# Altium footprint library Generic Footprint.PcbLib: 160 footprints (part 18 of 20) (continued)
## Symbol_FCC-Logo-15x10_Silkscreen [mil] (continued)
1(71.59,161.59) 1(71.59,162.26) 1(71.59,162.93) 1(71.59,163.6) 1(71.59,164.27) 1(71.59,164.94) 1(71.59,165.61) 1(71.59,166.28) 1(71.59,166.94) 1(71.59,167.61) 1(71.59,168.28) 1(71.59,168.95) 1(71.59,169.62) 1(71.59,170.29) 1(71.59,170.96) 1(71.59,171.63) 1(71.59,172.3) 1(71.59,172.97) 1(71.59,173.64) 1(71.59,174.31) 1(71.59,174.98) 1(71.59,175.65) 1(71.59,176.98) 1(71.59,229.86) 1(71.59,336.28) 1(71.59,336.94) 1(71.59,337.61) 1(71.59,338.28) 1(71.59,338.95) 1(71.59,339.62) 1(72.26,176.98) 1(72.26,177.65) 1(72.26,178.32) 1(72.26,229.86) 1(72.26,336.94) 1(72.26,337.61) 1(72.26,338.28) 1(72.26,340.29) 1(72.93,179.66) 1(72.93,229.19) 1(72.93,230.53) 1(72.93,339.62) 1(72.93,340.29) 1(72.93,341.63) 1(73.6,339.62) 1(73.6,340.29) 1(73.6,340.96) 1(73.6,341.63) 1(74.27,342.97) 1(74.94,341.63) 1(74.94,342.97) 1(74.94,343.64) 1(75.6,178.32) 1(75.6,178.99) 1(75.6,179.66) 1(75.6,342.3) 1(75.6,343.64) 1(76.27,344.31) 1(76.94,342.97) 1(76.94,344.31) 1(77.61,343.64) 1(78.28,344.31) 1(78.95,344.98) 1(78.95,346.31) 1(80.29,345.65) 1(80.29,346.31) 1(80.29,346.98) 1(81.63,346.31) 1(81.63,346.98) 1(81.63,347.65) 1(201.43,229.19) 1(201.43,230.53) 1(202.1,178.99) 1(202.77,172.97) 1(202.77,173.64) 1(202.77,174.31) 1(202.77,174.98) 1(202.77,175.65) 1(202.77,176.31) 1(202.77,176.98) 1(202.77,177.65) 1(202.77,230.53) 1(202.77,232.54) 1(202.77,233.2) 1(202.77,233.87) 1(202.77,234.54) 1(202.77,235.21) 1(202.77,235.88) 1(203.44,168.28) 1(203.44,168.95) 1(203.44,169.62) 1(203.44,170.29) 1(203.44,170.96) 1(203.44,171.63) 1(203.44,172.97) 1(203.44,173.64) 1(203.44,174.31) 1(203.44,174.98) 1(203.44,175.65) 1(203.44,176.31) 1(203.44,176.98) 1(203.44,230.53) 1(203.44,231.2) 1(203.44,232.54) 1(203.44,233.2) 1(203.44,233.87) 1(203.44,234.54) 1(203.44,235.21) 1(203.44,235.88) 1(203.44,237.22) 1(203.44,237.89) 1(203.44,238.56) 1(203.44,239.23) 1(203.44,239.9) 1(204.11,164.94) 1(204.11,165.61) 1(204.11,166.28) 1(204.11,166.94) 1(204.11,168.28) 1(204.11,168.95) 1(204.11,169.62) 1(204.11,170.29) 1(204.11,170.96) 1(204.11,171.63) 1(204.11,172.3) 1(204.11,172.97) 1(204.11,173.64) 1(204.11,174.31) 1(204.11,174.98) 1(204.11,175.65) 1(204.11,176.31) 1(204.11,176.98) 1(204.11,231.87) 1(204.11,232.54) 1(204.11,233.2) 1(204.11,233.87) 1(204.11,234.54) 1(204.11,235.21) 1(204.11,235.88) 1(204.11,236.55) 1(204.11,237.22) 1(204.11,237.89) 1(204.11,238.56) 1(204.11,239.23) 1(204.11,239.9) 1(204.11,241.24) 1(204.11,241.91) 1(204.11,242.57) 1(204.11,243.24) 1(204.11,243.91) 1(204.78,162.26) 1(204.78,163.6) 1(204.78,171.63) 1(204.78,237.22) 1(204.78,243.91) 1(204.78,244.58) 1(204.78,247.26) 1(205.45,158.24) 1(205.45,158.91) 1(205.45,159.58) 1(205.45,160.25) 1(205.45,160.92) 1(205.45,161.59) 1(205.45,162.93) 1(205.45,164.94) 1(205.45,165.61) 1(205.45,166.28) 1(205.45,166.94) 1(205.45,167.61) 1(205.45,168.28) 1(205.45,168.95) 1(205.45,169.62) 1(205.45,170.29) 1(205.45,170.96) 1(205.45,237.89) 1(205.45,238.56) 1(205.45,239.23) 1(205.45,239.9) 1(205.45,240.57) 1(205.45,241.24) 1(205.45,241.91) 1(205.45,242.57) 1(205.45,243.24) 1(205.45,244.58) 1(205.45,245.25) 1(205.45,245.92) 1(205.45,246.59) 1(205.45,247.93) 1(205.45,248.6) 1(205.45,249.27) 1(205.45,249.94) 1(205.45,250.61) 1(206.12,155.57) 1(206.12,156.24) 1(206.12,156.91) 1(206.12,157.57) 1(206.12,161.59) 1(206.12,162.26) 1(206.12,162.93) 1(206.12,163.6) 1(206.12,164.27) 1(206.12,164.94) 1(206.12,165.61) 1(206.12,166.28) 1(206.12,166.94) 1(206.12,241.24) 1(206.12,241.91) 1(206.12,242.57) 1(206.12,243.24) 1(206.12,243.91) 1(206.12,244.58) 1(206.12,245.25) 1(206.12,245.92) 1(206.12,246.59) 1(206.12,247.26) 1(206.12,247.93) 1(206.12,251.28) 1(206.12,251.94) 1(206.12,252.61) 1(206.12,253.28) 1(206.79,152.22) 1(206.79,152.89) 1(206.79,153.56) 1(206.79,154.23) 1(206.79,154.9) 1(206.79,158.24) 1(206.79,160.25) 1(206.79,161.59) 1(206.79,162.26) 1(206.79,162.93) 1(206.79,163.6) 1(206.79,245.25) 1(206.79,245.92) 1(206.79,246.59) 1(206.79,247.26) 1(206.79,247.93) 1(206.79,249.27) 1(206.79,249.94) 1(206.79,250.61) 1(206.79,253.95) 1(206.79,254.62) 1(206.79,255.29) 1(206.79,255.96) 1(206.79,256.63) 1(207.46,158.24) 1(207.46,160.25) 1(207.46,249.27) 1(207.46,249.94) 1(207.46,250.61) 1(208.12,150.21) 1(208.12,150.88) 1(208.12,151.55) 1(208.12,257.3) 1(208.12,257.97) 1(208.12,258.64) 1(208.79,146.87) 1(208.79,147.54) 1(208.79,148.2) 1(208.79,148.87) 1(208.79,150.21) 1(208.79,150.88) 1(208.79,257.97) 1(208.79,258.64) 1(208.79,259.98) 1(208.79,260.65) 1(208.79,261.31) 1(208.79,261.98) 1(209.46,144.86) 1(209.46,145.53) 1(209.46,146.87) 1(209.46,147.54) 1(209.46,148.2) 1(209.46,148.87) 1(209.46,149.54) 1(209.46,150.21) 1(209.46,150.88) 1(209.46,257.97) 1(209.46,258.64) 1(209.46,259.98) 1(209.46,260.65) 1(209.46,261.31) 1(209.46,261.98) 1(209.46,263.32) 1(210.13,142.85) 1(210.13,143.52) 1(210.13,144.86) 1(210.13,145.53) 1(210.13,146.87) 1(210.13,147.54) 1(210.13,148.2) 1(210.13,148.87) 1(210.13,259.31) 1(210.13,259.98) 1(210.13,260.65) 1(210.13,261.31) 1(210.13,261.98) 1(210.13,263.32) 1(210.13,264.66) 1(210.13,265.33) 1(210.13,266) 1(210.8,140.17) 1(210.8,140.84) 1(210.8,141.51) 1(210.8,142.85) 1(210.8,143.52) 1(210.8,144.86) 1(210.8,145.53) 1(210.8,146.2) 1(210.8,262.65) 1(210.8,263.32) 1(210.8,263.99) 1(210.8,264.66) 1(210.8,265.33) 1(210.8,266) 1(210.8,267.34) 1(210.8,268.01) 1(211.47,138.83) 1(211.47,139.5) 1(211.47,144.19) 1(211.47,264.66) 1(211.47,266.67) 1(211.47,268.01) 1(211.47,268.68) 1(211.47,269.35) 1(211.47,270.02) 1(212.14,136.16) 1(212.14,136.83) 1(212.14,137.5) 1(212.14,138.17) 1(212.14,140.17) 1(212.14,140.84) 1(212.14,142.18) 1(212.14,142.85) 1(212.14,143.52) 1(212.14,265.33) 1(212.14,266) 1(212.14,267.34) 1(212.14,270.68) 1(212.14,271.35) 1(212.14,272.02) 1(212.14,272.69) 1(212.14,416.59) 1(212.81,133.48) 1(212.81,134.15) 1(212.81,134.82) 1(212.81,135.49) 1(212.81,138.17) 1(212.81,138.83) 1(212.81,140.17) 1(212.81,140.84) 1(212.81,267.34) 1(212.81,268.01) 1(212.81,269.35) 1(212.81,270.02) 1(212.81,270.68) 1(212.81,273.36) 1(212.81,274.03) 1(212.81,274.7) 1(212.81,415.25) 1(212.81,415.92) 1(212.81,416.59) 1(213.48,132.81) 1(213.48,133.48) 1(213.48,134.15) 1(213.48,138.17) 1(213.48,138.83) 1(213.48,269.35) 1(213.48,270.02) 1(213.48,270.68) 1(213.48,274.7) 1(213.48,275.37) 1(213.48,276.04) 1(213.48,348.99) 1(213.48,349.66) 1(213.48,350.33) 1(213.48,351) 1(213.48,351.67) 1(213.48,352.34) 1(213.48,353.01) 1(213.48,353.68) 1(213.48,354.35) 1(213.48,355.02) 1(213.48,355.68) 1(213.48,356.35) 1(213.48,357.02) 1(213.48,357.69) 1(213.48,358.36) 1(213.48,359.03) 1(213.48,359.7) 1(213.48,360.37) 1(213.48,361.04) 1(213.48,361.71) 1(213.48,362.38) 1(213.48,363.05) 1(213.48,363.72) 1(213.48,364.39) 1(213.48,365.05) 1(213.48,365.72) 1(213.48,366.39) 1(213.48,367.06) 1(213.48,367.73) 1(213.48,368.4) 1(213.48,369.07) 1(213.48,369.74) 1(213.48,370.41) 1(213.48,371.08) 1(213.48,371.75) 1(213.48,372.42) 1(213.48,373.09) 1(213.48,373.76) 1(213.48,374.42) 1(213.48,375.09) 1(213.48,375.76) 1(213.48,376.43) 1(213.48,377.1) 1(213.48,377.77) 1(213.48,378.44) 1(213.48,379.11) 1(213.48,379.78) 1(213.48,380.45) 1(213.48,381.12) 1(213.48,381.79) 1(213.48,382.46) 1(213.48,383.13) 1(213.48,383.8) 1(213.48,384.46) 1(213.48,385.13) 1(213.48,385.8) 1(213.48,386.47) 1(213.48,387.14) 1(213.48,387.81) 1(213.48,388.48) 1(213.48,389.15) 1(213.48,389.82) 1(213.48,390.49) 1(213.48,391.16) 1(213.48,391.83) 1(213.48,392.5) 1(213.48,393.17) 1(213.48,393.83) 1(213.48,394.5) 1(213.48,395.17) 1(213.48,395.84) 1(213.48,396.51) 1(213.48,397.18) 1(213.48,397.85) 1(213.48,398.52) 1(213.48,399.19) 1(213.48,399.86) 1(213.48,400.53) 1(213.48,401.2) 1(213.48,401.87) 1(213.48,402.54) 1(213.48,403.2) 1(213.48,403.87) 1(213.48,404.54) 1(213.48,405.21) 1(213.48,405.88) 1(213.48,406.55) 1(213.48,407.22) 1(213.48,407.89) 1(213.48,408.56) 1(213.48,409.23) 1(213.48,409.9) 1(213.48,410.57) 1(213.48,411.24) 1(213.48,411.91) 1(213.48,412.57) 1(213.48,413.24) 1(213.48,413.91) 1(213.48,414.58) 1(213.48,415.25) 1(213.48,415.92) 1(213.48,416.59) 1(213.48,417.26) 1(214.15,132.81) 1(214.15,133.48) 1(214.15,134.15) 1(214.15,274.7) 1(214.15,276.04) 1(214.15,278.05) 1(214.15,348.99) 1(214.15,349.66) 1(214.15,350.33) 1(214.15,351) 1(214.15,351.67) 1(214.15,352.34) 1(214.15,353.01) 1(214.15,353.68) 1(214.15,354.35) 1(214.15,355.02) 1(214.15,355.68) 1(214.15,356.35) 1(214.15,357.02) 1(214.15,357.69) 1(214.15,358.36) 1(214.15,359.03) 1(214.15,359.7) 1(214.15,360.37) 1(214.15,361.04) 1(214.15,361.71) 1(214.15,362.38) 1(214.15,363.05) 1(214.15,363.72) 1(214.15,364.39) 1(214.15,365.05) 1(214.15,365.72) 1(214.15,366.39) 1(214.15,367.06) 1(214.15,367.73) 1(214.15,368.4) 1(214.15,369.07) 1(214.15,369.74) 1(214.15,370.41) 1(214.15,371.08) 1(214.15,371.75) 1(214.15,372.42) 1(214.15,373.09) 1(214.15,373.76) 1(214.15,374.42) 1(214.15,375.09) 1(214.15,375.76) 1(214.15,376.43) 1(214.15,377.1) 1(214.15,377.77) 1(214.15,378.44) 1(214.15,379.11) 1(214.15,379.78) 1(214.15,380.45) 1(214.15,381.12) 1(214.15,381.79) 1(214.15,382.46) 1(214.15,383.13) 1(214.15,383.8) 1(214.15,384.46) 1(214.15,385.13) 1(214.15,385.8) 1(214.15,386.47) 1(214.15,387.14) 1(214.15,387.81) 1(214.15,388.48) 1(214.15,389.15) 1(214.15,389.82) 1(214.15,390.49) 1(214.15,391.16) 1(214.15,391.83) 1(214.15,392.5) 1(214.15,393.17) 1(214.15,393.83) 1(214.15,394.5) 1(214.15,395.17) 1(214.15,395.84) 1(214.15,396.51) 1(214.15,397.18) 1(214.15,397.85) 1(214.15,398.52) 1(214.15,399.19) 1(214.15,399.86) 1(214.15,400.53) 1(214.15,401.2) 1(214.15,401.87) 1(214.15,402.54) 1(214.15,403.2) 1(214.15,403.87) 1(214.15,404.54) 1(214.15,405.21) 1(214.15,405.88) 1(214.15,406.55) 1(214.15,407.22) 1(214.15,407.89) 1(214.15,408.56) 1(214.15,409.23) 1(214.15,409.9) 1(214.15,410.57) 1(214.15,411.24) 1(214.15,411.91) 1(214.15,412.57) 1(214.15,413.24) 1(214.15,413.91) 1(214.15,415.25) 1(214.15,415.92) 1(214.82,130.13) 1(214.82,130.8) 1(214.82,131.47) 1(214.82,277.38) 1(214.82,278.72) 1(214.82,348.99) 1(214.82,349.66) 1(214.82,350.33) 1(214.82,351) 1(214.82,351.67) 1(214.82,352.34) 1(214.82,353.01) 1(214.82,353.68) 1(214.82,354.35) 1(214.82,355.02) 1(214.82,355.68) 1(214.82,356.35) 1(214.82,357.02) 1(214.82,357.69) 1(214.82,358.36) 1(214.82,359.03) 1(214.82,359.7) 1(214.82,360.37) 1(214.82,361.04) 1(214.82,361.71) 1(214.82,362.38) 1(214.82,363.05) 1(214.82,363.72) 1(214.82,364.39) 1(214.82,365.05) 1(214.82,365.72) 1(214.82,366.39) 1(214.82,367.06) 1(214.82,367.73) 1(214.82,368.4) 1(214.82,369.07) 1(214.82,369.74) 1(214.82,370.41) 1(214.82,371.08) 1(214.82,371.75) 1(214.82,372.42) 1(214.82,373.09) 1(214.82,373.76) 1(214.82,374.42) 1(214.82,375.09) 1(214.82,375.76) 1(214.82,376.43) 1(214.82,377.1) 1(214.82,377.77) 1(214.82,378.44) 1(214.82,379.11) 1(214.82,379.78) 1(214.82,380.45) 1(214.82,381.12) 1(214.82,381.79) 1(214.82,382.46) 1(214.82,383.13) 1(214.82,383.8) 1(214.82,384.46) 1(214.82,385.13) 1(214.82,385.8) 1(214.82,386.47) 1(214.82,387.14) 1(214.82,387.81) 1(214.82,388.48) 1(214.82,389.15) 1(214.82,389.82) 1(214.82,390.49) 1(214.82,391.16) 1(214.82,391.83) 1(214.82,392.5) 1(214.82,393.17) 1(214.82,393.83) 1(214.82,394.5) 1(214.82,395.17) 1(214.82,395.84) 1(214.82,396.51) 1(214.82,397.18) 1(214.82,397.85) 1(214.82,398.52) 1(214.82,399.19) 1(214.82,399.86) 1(214.82,400.53) 1(214.82,401.2) 1(214.82,401.87) 1(214.82,402.54) 1(214.82,403.2) 1(214.82,403.87) 1(214.82,404.54) 1(214.82,405.21) 1(214.82,405.88) 1(214.82,406.55) 1(214.82,407.22) 1(214.82,407.89) 1(214.82,408.56) 1(214.82,409.23) 1(214.82,409.9) 1(214.82,410.57) 1(214.82,411.24) 1(214.82,411.91) 1(214.82,412.57) 1(214.82,413.24) 1(215.49,128.79) 1(215.49,130.13) 1(215.49,130.8) 1(215.49,131.47) 1(215.49,132.14) 1(215.49,132.81) 1(215.49,276.04) 1(215.49,276.71) 1(215.49,277.38) 1(215.49,278.05) 1(215.49,278.72) 1(215.49,280.05) 1(215.49,347.65) 1(215.49,348.32) 1(215.49,413.91) 1(216.16,125.45) 1(216.16,126.79) 1(216.16,127.46) 1(216.16,128.79) 1(216.16,130.13) 1(216.16,130.8) 1(216.16,131.47) 1(216.16,277.38) 1(216.16,278.05) 1(216.16,278.72) 1(216.16,280.05) 1(216.16,281.39) 1(216.16,282.06) 1(216.16,347.65) 1(216.83,124.11) 1(216.83,126.79) 1(216.83,127.46) 1(216.83,128.79) 1(216.83,129.46) 1(216.83,279.39) 1(216.83,280.05) 1(216.83,281.39) 1(216.83,282.06) 1(216.83,283.4) 1(216.83,285.41) 1(216.83,346.98) 1(217.49,123.44) 1(217.49,125.45) 1(217.49,126.12) 1(217.49,126.79) 1(217.49,127.46) 1(217.49,128.13) 1(217.49,280.72) 1(217.49,281.39) 1(217.49,282.06) 1(217.49,282.73) 1(217.49,283.4) 1(217.49,284.74) 1(217.49,286.75) 1(218.16,121.43) 1(218.16,122.1) 1(218.16,122.77) 1(218.16,286.08) 1(218.83,120.09) 1(218.83,120.76) 1(218.83,124.78) 1(218.83,125.45) 1(218.83,283.4) 1(218.83,284.07) 1(218.83,287.42) 1(218.83,288.09) 1(218.83,288.76) 1(219.5,118.76) 1(219.5,119.42) 1(219.5,120.09) 1(219.5,288.76) 1(219.5,289.42) 1(219.5,290.09) 1(220.17,116.75) 1(220.17,117.42) 1(220.17,118.76) 1(220.17,119.42) 1(220.17,120.09) 1(220.17,288.76) 1(220.17,289.42) 1(220.17,290.09) 1(220.17,291.43) 1(220.84,116.08) 1(220.84,116.75) 1(220.84,117.42) 1(220.84,118.09) 1(220.84,118.76) 1(220.84,119.42) 1(220.84,289.42) 1(220.84,290.09) 1(220.84,291.43) 1(220.84,292.77) 1(221.51,290.76) 1(222.18,112.73) 1(222.18,114.07) 1(222.18,116.08) 1(222.18,116.75) 1(222.18,117.42) 1(222.18,291.43) 1(222.18,292.1) 1(222.18,292.77) 1(222.18,294.11) 1(222.18,294.78) 1(222.85,111.39) 1(222.85,112.06) 1(222.85,114.07) 1(222.85,115.41) 1(222.85,116.08) 1(222.85,292.77) 1(222.85,293.44) 1(222.85,294.11) 1(222.85,294.78) 1(222.85,296.12) 1(222.85,296.79) 1(223.52,110.05) 1(223.52,110.72) 1(223.52,112.06) 1(223.52,112.73) 1(223.52,114.07) 1(223.52,114.74) 1(223.52,294.11) 1(223.52,294.78) 1(223.52,296.12) 1(223.52,296.79) 1(223.52,297.46) 1(223.52,298.13) 1(223.52,298.8) 1(224.19,108.72) 1(224.19,112.06) 1(224.19,112.73) 1(224.19,113.4) 1(224.19,295.45) 1(224.19,296.12) 1(224.19,296.79) 1(224.19,300.13) 1(224.86,109.39) 1(224.86,299.46) 1(225.53,106.71) 1(225.53,107.38) 1(225.53,108.05) 1(225.53,300.8) 1(225.53,301.47) 1(225.53,302.14) 1(226.2,106.04) 1(226.2,106.71) 1(226.2,107.38) 1(226.2,300.8) 1(226.2,301.47) 1(226.2,302.81) 1(226.86,104.7) 1(226.86,106.04) 1(226.86,106.71) 1(226.86,107.38) 1(226.86,300.8) 1(226.86,301.47) 1(226.86,302.81) 1(227.53,103.36) 1(227.53,104.7) 1(227.53,106.04) 1(227.53,302.81) 1(227.53,305.49) 1(228.2,101.35) 1(228.2,102.02) 1(228.2,104.03) 1(228.2,304.82) 1(228.2,306.16) 1(228.2,306.83) 1(228.87,102.69) 1(228.87,103.36) 1(228.87,104.7) 1(228.87,105.37) 1(228.87,303.48) 1(228.87,304.15) 1(228.87,305.49) 1(228.87,307.5) 1(229.54,99.35) 1(229.54,100.02) 1(229.54,100.68) 1(229.54,101.35) 1(229.54,102.02) 1(229.54,103.36) 1(229.54,305.49) 1(229.54,306.16) 1(229.54,306.83) 1(229.54,307.5) 1(229.54,308.17) 1(229.54,308.83) 1(230.21,98.68) 1(230.21,101.35) 1(230.21,102.02) 1(230.21,306.16) 1(230.21,306.83) 1(230.21,307.5) 1(230.21,309.5) 1(230.21,310.17) 1(230.88,98.01) 1(230.88,98.68) 1(230.88,310.17) 1(230.88,310.84) 1(231.55,98.68) 1(232.22,95.33) 1(232.22,96) 1(232.22,96.67) 1(232.22,98.01) 1(232.22,310.17) 1(232.22,312.18) 1(232.22,312.85) 1(232.89,95.33) 1(232.89,96) 1(232.89,96.67) 1(232.89,97.34) 1(232.89,98.01) 1(232.89,311.51) 1(232.89,312.18) 1(232.89,312.85) 1(232.89,313.52) 1(233.56,93.32) 1(233.56,93.99) 1(233.56,96) 1(233.56,96.67) 1(233.56,312.18) 1(233.56,312.85) 1(233.56,313.52) 1(233.56,314.86) 1(233.56,315.53) 1(234.23,93.99) 1(234.23,94.66) 1(234.23,95.33) 1(234.23,313.52) 1(234.23,314.86) 1(234.9,91.31) 1(234.9,91.98) 1(234.9,92.65) 1(234.9,93.99) 1(234.9,314.19) 1(234.9,315.53) 1(234.9,316.2) 1(234.9,316.87) 1(234.9,317.54) 1(235.57,91.98) 1(235.57,314.86) 1(235.57,315.53) 1(235.57,316.87) 1(236.23,89.31) 1(236.23,89.98) 1(236.23,90.65) 1(236.23,91.98) 1(236.23,316.87) 1(236.23,318.2) 1(236.23,318.87) 1(236.23,319.54) 1(236.9,88.64) 1(236.9,318.87) 1(236.9,320.21) 1(237.57,87.97) 1(237.57,318.87) 1(237.57,320.21) 1(238.24,320.21) 1(238.24,320.88) 1(238.24,321.55) 1(238.24,322.22) 1(238.91,85.96) 1(238.91,86.63) 1(238.91,320.88) 1(238.91,321.55) 1(238.91,322.89) 1(239.58,84.62) 1(239.58,85.96) 1(239.58,86.63) 1(239.58,320.88) 1(239.58,321.55) 1(239.58,322.22) 1(240.25,83.28) 1(240.25,83.95) 1(240.25,86.63) 1(240.25,87.3) 1(240.25,322.22) 1(240.25,322.89) 1(240.25,324.23) 1(240.25,324.9) 1(240.92,82.61) 1(240.92,83.95) 1(240.92,84.62) 1(240.92,85.29) 1(240.92,85.96) 1(240.92,322.89) 1(240.92,323.56) 1(240.92,324.23) 1(240.92,325.57) 1(241.59,84.62) 1(241.59,324.23) 1(241.59,324.9) 1(241.59,326.24) 1(242.26,81.28) 1(242.26,81.94) 1(242.26,83.95) 1(242.26,324.9) 1(242.26,326.91) 1(242.26,327.57) 1(242.93,80.61) 1(242.93,81.28) 1(242.93,81.94) 1(242.93,326.91) 1(242.93,328.24) 1(243.6,79.94) 1(243.6,80.61) 1(243.6,81.94) 1(243.6,326.91) 1(243.6,327.57) 1(243.6,328.24) 1(243.6,328.91) 1(244.27,79.27) 1(244.27,79.94) 1(244.27,81.28) 1(244.27,327.57) 1(244.27,328.24) 1(244.27,328.91) 1(244.27,329.58) 1(244.94,77.93) 1(244.94,79.27) 1(244.94,80.61) 1(244.94,330.92) 1(245.6,76.59) 1(245.6,77.26) 1(245.6,79.94) 1(245.6,328.91) 1(245.6,329.58) 1(245.6,331.59) 1(246.27,75.92) 1(246.27,77.26) 1(246.27,77.93) 1(246.27,78.6) 1(246.27,79.27) 1(246.27,329.58) 1(246.27,330.92) 1(246.27,331.59) 1(246.27,332.26) 1(246.94,75.25) 1(246.94,76.59) 1(246.94,77.26) 1(246.94,77.93) 1(246.94,330.25) 1(246.94,330.92) 1(246.94,332.26) 1(246.94,332.93) 1(247.61,75.92) 1(247.61,76.59) 1(247.61,331.59) 1(247.61,332.26) 1(247.61,334.27) 1(248.28,333.6) 1(248.28,334.94) 1(248.95,73.24) 1(248.95,73.91) 1(248.95,74.58) 1(248.95,75.92) 1(248.95,335.61) 1(249.62,72.57) 1(249.62,73.24) 1(249.62,73.91) 1(249.62,335.61) 1(249.62,336.28) 1(250.29,71.91) 1(250.29,72.57) 1(250.29,73.24) 1(250.29,73.91) 1(250.29,335.61) 1(250.29,336.28) 1(250.29,336.94) 1(250.96,71.24) 1(250.96,71.91) 1(250.96,72.57) 1(250.96,336.28) 1(250.96,336.94) 1(250.96,337.61) 1(251.63,69.9) 1(251.63,70.57) 1(251.63,71.24) 1(251.63,337.61) 1(251.63,338.28) 1(252.3,69.23) 1(252.3,71.24) 1(252.3,71.91) 1(252.3,198.4) 1(252.3,199.07) 1(252.3,199.74) 1(252.3,200.41) 1(252.3,201.08) 1(252.3,201.75) 1(252.3,202.42) 1(252.3,203.09) 1(252.3,203.76) 1(252.3,204.42) 1(252.3,205.09) 1(252.3,205.76) 1(252.3,206.43) 1(252.3,207.1) 1(252.3,207.77) 1(252.3,208.44) 1(252.3,209.11) 1(252.3,209.78) 1(252.3,210.45) 1(252.3,336.94) 1(252.3,338.95) 1(252.97,68.56) 1(252.97,69.9) 1(252.97,188.36) 1(252.97,189.03) 1(252.97,189.7) 1(252.97,190.37) 1(252.97,191.04) 1(252.97,191.71) 1(252.97,192.38) 1(252.97,193.05) 1(252.97,193.72) 1(252.97,194.39) 1(252.97,195.05) 1(252.97,195.72) 1(252.97,196.39) 1(252.97,197.06) 1(252.97,197.73) 1(252.97,199.07) 1(252.97,199.74) 1(252.97,200.41) 1(252.97,201.08) 1(252.97,201.75) 1(252.97,202.42) 1(252.97,203.09) 1(252.97,203.76) 1(252.97,204.42) 1(252.97,205.09) 1(252.97,205.76) 1(252.97,206.43) 1(252.97,207.1) 1(252.97,207.77) 1(252.97,208.44) 1(252.97,209.11) 1(252.97,209.78) 1(252.97,211.12) 1(252.97,211.79) 1(252.97,212.46) 1(252.97,213.13) 1(252.97,213.79) 1(252.97,214.46) 1(252.97,215.13) 1(252.97,215.8) 1(252.97,216.47) 1(252.97,217.14) 1(252.97,217.81) 1(252.97,218.48) 1(252.97,219.15) 1(252.97,219.82) 1(252.97,220.49) 1(252.97,337.61) 1(252.97,338.95) 1(252.97,339.62) 1(252.97,340.29) 1(253.64,69.23) 1(253.64,69.9) 1(253.64,183.01) 1(253.64,183.68) 1(253.64,184.35) 1(253.64,185.02) 1(253.64,185.68) 1(253.64,186.35) 1(253.64,187.02) 1(253.64,188.36) 1(253.64,189.03) 1(253.64,189.7) 1(253.64,190.37) 1(253.64,191.04) 1(253.64,191.71) 1(253.64,192.38) 1(253.64,193.05) 1(253.64,193.72) 1(253.64,194.39) 1(253.64,195.05) 1(253.64,195.72) 1(253.64,196.39) 1(253.64,197.06) 1(253.64,199.07) 1(253.64,199.74) 1(253.64,200.41) 1(253.64,201.08) 1(253.64,201.75) 1(253.64,202.42) 1(253.64,203.09) 1(253.64,203.76) 1(253.64,204.42) 1(253.64,205.09) 1(253.64,205.76) 1(253.64,206.43) 1(253.64,207.1) 1(253.64,207.77) 1(253.64,208.44) 1(253.64,209.11) 1(253.64,209.78) 1(253.64,211.79) 1(253.64,212.46) 1(253.64,213.13) 1(253.64,213.79) 1(253.64,214.46) 1(253.64,215.13) 1(253.64,215.8) 1(253.64,216.47) 1(253.64,217.14) 1(253.64,217.81) 1(253.64,218.48) 1(253.64,219.15) 1(253.64,219.82) 1(253.64,220.49) 1(253.64,221.16) 1(253.64,221.83) 1(253.64,222.5) 1(253.64,223.17) 1(253.64,223.83) 1(253.64,224.5) 1(253.64,225.17) 1(253.64,225.84) 1(253.64,226.51) 1(253.64,338.95) 1(253.64,340.29) 1(253.64,340.96) 1(254.31,67.22) 1(254.31,69.23) 1(254.31,178.32) 1(254.31,178.99) 1(254.31,179.66) 1(254.31,180.33) 1(254.31,181) 1(254.31,181.67) 1(254.31,183.01) 1(254.31,183.68) 1(254.31,184.35) 1(254.31,185.02) 1(254.31,185.68) 1(254.31,186.35) 1(254.31,187.02) 1(254.31,187.69) 1(254.31,188.36) 1(254.31,189.03) 1(254.31,189.7) 1(254.31,190.37) 1(254.31,191.04) 1(254.31,191.71) 1(254.31,192.38) 1(254.31,193.05) 1(254.31,193.72) 1(254.31,194.39) 1(254.31,195.05) 1(254.31,195.72) 1(254.31,196.39) 1(254.31,197.06) 1(254.31,211.79) 1(254.31,212.46) 1(254.31,213.13) 1(254.31,213.79) 1(254.31,214.46) 1(254.31,215.13) 1(254.31,215.8) 1(254.31,216.47) 1(254.31,217.14) 1(254.31,217.81) 1(254.31,218.48) 1(254.31,219.15) 1(254.31,219.82) 1(254.31,220.49) 1(254.31,221.83) 1(254.31,222.5) 1(254.31,223.17) 1(254.31,223.83) 1(254.31,224.5) 1(254.31,225.17) 1(254.31,225.84) 1(254.31,226.51) 1(254.31,227.85) 1(254.31,228.52) 1(254.31,229.19) 1(254.31,229.86) 1(254.31,230.53) 1(254.31,340.29) 1(254.31,341.63) 1(254.31,342.3) 1(254.98,65.88) 1(254.98,66.55) 1(254.98,67.89) 1(254.98,182.34) 1(254.98,183.01) 1(254.98,183.68) 1(254.98,184.35) 1(254.98,185.02) 1(254.98,185.68) 1(254.98,186.35) 1(254.98,187.02) 1(254.98,222.5) 1(254.98,223.17) 1(254.98,223.83) 1(254.98,224.5) 1(254.98,225.17) 1(254.98,225.84) 1(254.98,226.51) 1(254.98,227.18) 1(255.64,65.21) 1(255.64,66.55) 1(255.64,174.98) 1(255.64,176.98) 1(255.64,178.32) 1(255.64,178.99) 1(255.64,179.66) 1(255.64,180.33) 1(255.64,181) 1(255.64,181.67) 1(255.64,221.83) 1(255.64,227.18) 1(255.64,227.85) 1(255.64,228.52) 1(255.64,229.19) 1(255.64,229.86) 1(255.64,230.53) 1(255.64,231.87) 1(255.64,233.87) 1(255.64,342.97) 1(256.31,65.88) 1(256.31,66.55) 1(256.31,168.95) 1(256.31,169.62) 1(256.31,170.29) 1(256.31,174.98) 1(256.31,177.65) 1(256.31,178.32) 1(256.31,178.99) 1(256.31,179.66) 1(256.31,180.33) 1(256.31,181) 1(256.31,181.67) 1(256.31,227.18) 1(256.31,227.85) 1(256.31,228.52) 1(256.31,229.19) 1(256.31,229.86) 1(256.31,230.53) 1(256.31,231.2) 1(256.31,231.87) 1(256.31,233.87) 1(256.31,238.56) 1(256.31,240.57) 1(256.31,342.97) 1(256.31,343.64) 1(256.98,64.54) 1(256.98,65.21) 1(256.98,65.88) 1(256.98,165.61) 1(256.98,166.28) 1(256.98,167.61) 1(256.98,168.95) 1(256.98,169.62) 1(256.98,170.29) 1(256.98,173.64) 1(256.98,174.31) 1(256.98,174.98) 1(256.98,175.65) 1(256.98,176.31) 1(256.98,231.87) 1(256.98,232.54) 1(256.98,233.2) 1(256.98,233.87) 1(256.98,234.54) 1(256.98,235.21) 1(256.98,238.56) 1(256.98,240.57) 1(256.98,241.91) 1(256.98,242.57) 1(256.98,243.24) 1(256.98,342.97) 1(256.98,343.64) 1(256.98,344.31) 1(257.65,63.2) 1(257.65,63.87) 1(257.65,64.54) 1(257.65,65.21) 1(257.65,162.26) 1(257.65,162.93) 1(257.65,163.6) 1(257.65,164.27) 1(257.65,165.61) 1(257.65,166.28) 1(257.65,167.61) 1(257.65,170.29) 1(257.65,170.96) 1(257.65,171.63) 1(257.65,172.3) 1(257.65,172.97) 1(257.65,235.88) 1(257.65,236.55) 1(257.65,237.22) 1(257.65,237.89) 1(257.65,241.91) 1(257.65,242.57) 1(257.65,243.24) 1(257.65,244.58) 1(257.65,245.25) 1(257.65,344.31) 1(257.65,344.98) 1(257.65,345.65) 1(258.32,62.54) 1(258.32,63.87) 1(258.32,64.54) 1(258.32,162.26) 1(258.32,167.61) 1(258.32,168.28) 1(258.32,168.95) 1(258.32,169.62) 1(258.32,238.56) 1(258.32,239.23) 1(258.32,239.9) 1(258.32,240.57) 1(258.32,241.24) 1(258.32,241.91) 1(258.32,243.91) 1(258.32,245.92) 1(258.32,246.59) 1(258.32,343.64) 1(258.32,344.98) 1(258.99,61.87) 1(258.99,63.2) 1(258.99,63.87) 1(258.99,159.58) 1(258.99,160.25) 1(258.99,160.92) 1(258.99,161.59) 1(258.99,162.26) 1(258.99,162.93) 1(258.99,163.6) 1(258.99,164.27) 1(258.99,164.94) 1(258.99,165.61) 1(258.99,166.28) 1(258.99,166.94) 1(258.99,242.57) 1(258.99,243.24) 1(258.99,243.91) 1(258.99,244.58) 1(258.99,245.25) 1(258.99,245.92) 1(258.99,247.26) 1(258.99,247.93) 1(258.99,248.6) 1(258.99,344.31) 1(258.99,344.98) 1(258.99,345.65) 1(258.99,346.31) 1(259.66,62.54) 1(259.66,63.2) 1(259.66,158.24) 1(259.66,158.91) 1(259.66,160.25) 1(259.66,160.92) 1(259.66,161.59) 1(259.66,162.93) 1(259.66,163.6) 1(259.66,164.27) 1(259.66,243.91) 1(259.66,244.58) 1(259.66,245.25) 1(259.66,245.92) 1(259.66,247.26) 1(259.66,247.93) 1(259.66,249.27) 1(259.66,249.94) 1(259.66,250.61) 1(259.66,345.65) 1(259.66,346.31) 1(259.66,346.98) 1(260.33,61.2) 1(260.33,61.87) 1(260.33,62.54) 1(260.33,156.24) 1(260.33,156.91) 1(260.33,158.24) 1(260.33,158.91) 1(260.33,160.25) 1(260.33,160.92) 1(260.33,161.59) 1(260.33,247.26) 1(260.33,247.93) 1(260.33,249.27) 1(260.33,249.94) 1(260.33,250.61) 1(260.33,251.28) 1(260.33,251.94) 1(260.33,252.61) 1(260.33,253.28) 1(260.33,346.31) 1(260.33,347.65) 1(261,59.86) 1(261,60.53) 1(261,61.2) 1(261,61.87) 1(261,156.24) 1(261,156.91) 1(261,157.57) 1(261,158.24) 1(261,158.91) 1(261,249.27) 1(261,249.94) 1(261,250.61) 1(261,251.94) 1(261,252.61) 1(261,253.28) 1(261,348.32) 1(261.67,59.19) 1(261.67,61.2) 1(261.67,155.57) 1(261.67,156.24) 1(261.67,252.61) 1(261.67,348.99) 1(262.34,58.52) 1(262.34,59.86) 1(262.34,150.88) 1(262.34,156.91) 1(262.34,251.94) 1(262.34,253.28) 1(262.34,257.97) 1(262.34,349.66) 1(263.01,59.19) 1(263.01,59.86) 1(263.01,148.2) 1(263.01,148.87) 1(263.01,149.54) 1(263.01,150.88) 1(263.01,152.89) 1(263.01,153.56) 1(263.01,154.23) 1(263.01,154.9) 1(263.01,253.95) 1(263.01,254.62) 1(263.01,255.29) 1(263.01,257.97) 1(263.01,259.31) 1(263.01,259.98) 1(263.01,260.65) 1(263.01,349.66) 1(263.01,350.33) 1(263.68,57.85) 1(263.68,58.52) 1(263.68,59.19) 1(263.68,146.87) 1(263.68,148.2) 1(263.68,148.87) 1(263.68,149.54) 1(263.68,150.88) 1(263.68,151.55) 1(263.68,152.22) 1(263.68,255.96) 1(263.68,256.63) 1(263.68,257.3) 1(263.68,257.97) 1(263.68,259.31) 1(263.68,259.98) 1(263.68,260.65) 1(263.68,261.31) 1(263.68,261.98) 1(263.68,349.66) 1(263.68,350.33) 1(263.68,351) 1(264.35,56.51) 1(264.35,57.18) 1(264.35,57.85) 1(264.35,58.52) 1(264.35,144.86) 1(264.35,145.53) 1(264.35,146.2) 1(264.35,146.87) 1(264.35,148.2) 1(264.35,149.54) 1(264.35,150.21) 1(264.35,258.64) 1(264.35,259.31) 1(264.35,260.65) 1(264.35,261.31) 1(264.35,261.98) 1(264.35,262.65) 1(264.35,263.32) 1(264.35,350.33) 1(264.35,351) 1(264.35,351.67) 1(264.35,352.34) 1(265.01,57.18) 1(265.01,146.87) 1(265.01,147.54) 1(265.01,148.87) 1(265.01,259.98) 1(265.01,261.31) 1(265.01,263.99) 1(265.01,351) 1(265.68,56.51) 1(265.68,57.18) 1(265.68,57.85) 1(265.68,142.85) 1(265.68,143.52) 1(265.68,144.19) 1(265.68,145.53) 1(265.68,261.98) 1(265.68,263.32) 1(265.68,264.66) 1(265.68,265.33) 1(265.68,266) 1(265.68,353.01) 1(266.35,55.84) 1(266.35,142.18) 1(266.35,143.52) 1(266.35,145.53) 1(266.35,263.32) 1(266.35,265.33) 1(266.35,266) 1(266.35,266.67) 1(266.35,267.34) 1(266.35,353.68) 1(267.02,55.17) 1(267.02,55.84) 1(267.02,56.51) 1(267.02,140.84) 1(267.02,142.18) 1(267.02,143.52) 1(267.02,265.33) 1(267.02,266) 1(267.02,266.67) 1(267.02,267.34) 1(267.02,268.01) 1(267.69,54.5) 1(267.69,55.17) 1(267.69,55.84) 1(267.69,140.84) 1(267.69,141.51) 1(267.69,142.18) 1(267.69,266.67) 1(267.69,267.34) 1(267.69,268.01) 1(267.69,354.35) 1(268.36,53.83) 1(268.36,54.5) 1(268.36,55.17) 1(268.36,137.5) 1(268.36,139.5) 1(268.36,140.17) 1(268.36,140.84) 1(268.36,268.01) 1(268.36,271.35) 1(268.36,355.02) 1(269.03,52.5) 1(269.03,53.16) 1(269.03,53.83) 1(269.03,137.5) 1(269.03,268.68) 1(269.03,269.35) 1(269.03,271.35) 1(269.03,272.69) 1(269.03,273.36) 1(269.03,354.35) 1(269.03,355.02) 1(269.03,355.68) 1(269.7,51.83) 1(269.7,53.16) 1(269.7,53.83) 1(269.7,54.5) 1(269.7,134.82) 1(269.7,135.49) 1(269.7,137.5) 1(269.7,138.17) 1(269.7,138.83) 1(269.7,270.02) 1(269.7,270.68) 1(269.7,271.35) 1(269.7,272.69) 1(269.7,274.03) 1(269.7,274.7) 1(269.7,354.35) 1(269.7,355.02) 1(269.7,355.68) 1(269.7,356.35) 1(270.37,52.5) 1(270.37,53.16) 1(270.37,133.48) 1(270.37,134.15) 1(270.37,134.82) 1(270.37,135.49) 1(270.37,136.16) 1(270.37,136.83) 1(270.37,272.02) 1(270.37,272.69) 1(270.37,273.36) 1(270.37,274.03) 1(270.37,274.7) 1(270.37,275.37) 1(270.37,355.68) 1(270.37,356.35) 1(270.37,357.02) 1(271.04,51.16) 1(271.04,51.83) 1(271.04,52.5) 1(271.04,131.47) 1(271.04,132.14) 1(271.04,132.81) 1(271.04,133.48) 1(271.04,134.15) 1(271.04,134.82) 1(271.04,273.36) 1(271.04,274.03) 1(271.04,274.7) 1(271.04,275.37) 1(271.04,276.04) 1(271.04,276.71) 1(271.04,356.35) 1(271.04,357.69) 1(271.71,134.15) 1(271.71,135.49) 1(271.71,275.37) 1(271.71,276.04) 1(271.71,277.38) 1(271.71,357.02) 1(271.71,358.36) 1(272.38,50.49) 1(272.38,51.83) 1(272.38,130.13) 1(272.38,130.8) 1(272.38,132.14) 1(272.38,133.48) 1(272.38,276.04) 1(272.38,276.71) 1(272.38,278.05) 1(272.38,278.72) 1(272.38,357.02) 1(272.38,359.03) 1(273.05,49.82) 1(273.05,50.49) 1(273.05,51.16) 1(273.05,130.13) 1(273.05,132.14) 1(273.05,276.71) 1(273.05,278.05) 1(273.05,278.72) 1(273.05,279.39) 1(273.05,280.05) 1(273.72,49.15) 1(273.72,49.82) 1(273.72,51.16) 1(273.72,128.13) 1(273.72,130.13) 1(273.72,278.05) 1(273.72,278.72) 1(273.72,279.39) 1(273.72,280.05) 1(273.72,359.7) 1(274.38,48.48) 1(274.38,49.15) 1(274.38,49.82) 1(274.38,50.49) 1(274.38,128.13) 1(274.38,129.46) 1(274.38,279.39) 1(274.38,280.05) 1(274.38,359.7) 1(274.38,360.37) 1(275.05,47.81) 1(275.05,48.48) 1(275.05,125.45) 1(275.05,126.12) 1(275.05,128.79) 1(275.05,360.37) 1(275.05,361.04) 1(275.72,47.14) 1(275.72,49.15) 1(275.72,124.78) 1(275.72,126.12) 1(275.72,127.46) 1(275.72,128.13) 1(275.72,280.72) 1(275.72,281.39) 1(275.72,282.73) 1(275.72,283.4) 1(275.72,284.07) 1(275.72,359.7) 1(276.39,48.48) 1(276.39,123.44) 1(276.39,124.11) 1(276.39,124.78) 1(276.39,125.45) 1(276.39,126.12) 1(276.39,126.79) 1(276.39,282.06) 1(276.39,283.4) 1(276.39,284.07) 1(276.39,284.74) 1(276.39,285.41) 1(276.39,286.08) 1(277.06,45.8) 1(277.06,46.47) 1(277.06,47.14) 1(277.06,47.81) 1(277.06,122.1) 1(277.06,122.77) 1(277.06,123.44) 1(277.06,124.78) 1(277.06,125.45) 1(277.06,283.4) 1(277.06,284.07) 1(277.06,284.74) 1(277.06,285.41) 1(277.06,286.75) 1(277.06,360.37) 1(277.06,361.04) 1(277.06,362.38) 1(277.73,46.47) 1(277.73,47.14) 1(277.73,47.81) 1(277.73,121.43) 1(277.73,122.77) 1(277.73,123.44) 1(277.73,284.74) 1(277.73,285.41) 1(277.73,286.75) 1(277.73,287.42) 1(277.73,361.04) 1(277.73,361.71) 1(277.73,362.38) 1(277.73,363.05) 1(278.4,45.13) 1(278.4,45.8) 1(278.4,363.05) 1(278.4,363.72) 1(279.07,46.47) 1(279.07,121.43) 1(279.07,122.77) 1(279.07,286.75) 1(279.07,287.42) 1(279.07,362.38) 1(279.07,364.39) 1(279.74,44.46) 1(279.74,45.8) 1(279.74,121.43) 1(279.74,195.05) 1(279.74,195.72) 1(279.74,196.39) 1(279.74,197.06) 1(279.74,197.73) 1(279.74,198.4) 1(279.74,199.07) 1(279.74,199.74) 1(279.74,200.41) 1(279.74,201.08) 1(279.74,201.75) 1(279.74,202.42) 1(279.74,203.09) 1(279.74,203.76) 1(279.74,204.42) 1(279.74,205.09) 1(279.74,205.76) 1(279.74,206.43) 1(279.74,207.1) 1(279.74,207.77) 1(279.74,208.44) 1(279.74,209.11) 1(279.74,209.78) 1(279.74,210.45) 1(279.74,211.12) 1(279.74,211.79) 1(279.74,212.46) 1(279.74,213.13) 1(279.74,213.79) 1(279.74,287.42) 1(279.74,288.09) 1(279.74,288.76) 1(279.74,290.09) 1(279.74,363.05) 1(279.74,363.72) 1(280.41,43.79) 1(280.41,44.46) 1(280.41,45.13) 1(280.41,118.09) 1(280.41,119.42) 1(280.41,120.09) 1(280.41,120.76) 1(280.41,188.36) 1(280.41,189.03) 1(280.41,189.7) 1(280.41,190.37) 1(280.41,191.04) 1(280.41,191.71) 1(280.41,192.38) 1(280.41,193.05) 1(280.41,195.05) 1(280.41,195.72) 1(280.41,196.39) 1(280.41,197.06) 1(280.41,197.73) 1(280.41,198.4) 1(280.41,199.07) 1(280.41,199.74) 1(280.41,200.41) 1(280.41,201.08) 1(280.41,201.75) 1(280.41,202.42) 1(280.41,203.09) 1(280.41,203.76) 1(280.41,204.42) 1(280.41,205.09) 1(280.41,205.76) 1(280.41,206.43) 1(280.41,207.1) 1(280.41,207.77) 1(280.41,208.44) 1(280.41,209.11) 1(280.41,209.78) 1(280.41,210.45) 1(280.41,211.12) 1(280.41,211.79) 1(280.41,212.46) 1(280.41,213.13) 1(280.41,213.79) 1(280.41,215.8) 1(280.41,216.47) 1(280.41,217.14) 1(280.41,217.81) 1(280.41,218.48) 1(280.41,219.15) 1(280.41,219.82) 1(280.41,220.49) 1(280.41,290.09) 1(280.41,290.76) 1(280.41,363.72) 1(280.41,365.05) 1(281.08,42.46) 1(281.08,43.13) 1(281.08,43.79) 1(281.08,45.13) 1(281.08,118.09) 1(281.08,183.68) 1(281.08,184.35) 1(281.08,185.02) 1(281.08,185.68) 1(281.08,186.35) 1(281.08,188.36) 1(281.08,189.03) 1(281.08,189.7) 1(281.08,190.37) 1(281.08,191.04) 1(281.08,191.71) 1(281.08,192.38) 1(281.08,193.05) 1(281.08,194.39) 1(281.08,195.05) 1(281.08,195.72) 1(281.08,196.39) 1(281.08,197.06) 1(281.08,197.73) 1(281.08,198.4) 1(281.08,199.07) 1(281.08,199.74) 1(281.08,200.41) 1(281.08,201.08) 1(281.08,201.75) 1(281.08,202.42) 1(281.08,203.09) 1(281.08,203.76) 1(281.08,204.42) 1(281.08,205.09) 1(281.08,205.76) 1(281.08,206.43) 1(281.08,207.1) 1(281.08,207.77) 1(281.08,208.44) 1(281.08,209.11) 1(281.08,209.78) 1(281.08,210.45) 1(281.08,211.12) 1(281.08,211.79) 1(281.08,212.46) 1(281.08,213.13) 1(281.08,213.79) 1(281.08,214.46) 1(281.08,215.8) 1(281.08,216.47) 1(281.08,217.14) 1(281.08,217.81) 1(281.08,218.48) 1(281.08,219.15) 1(281.08,219.82) 1(281.08,220.49) 1(281.08,221.83) 1(281.08,222.5) 1(281.08,223.17) 1(281.08,223.83) 1(281.08,224.5) 1(281.08,225.17) 1(281.08,289.42) 1(281.08,290.76) 1(281.08,292.1) 1(281.08,365.72) 1(281.75,44.46) 1(281.75,116.75) 1(281.75,117.42) 1(281.75,118.09) 1(281.75,118.76) 1(281.75,179.66) 1(281.75,180.33) 1(281.75,181) 1(281.75,181.67) 1(281.75,182.34) 1(281.75,183.01) 1(281.75,183.68) 1(281.75,187.02) 1(281.75,193.72) 1(281.75,225.17) 1(281.75,225.84) 1(281.75,226.51) 1(281.75,227.18) 1(281.75,227.85) 1(281.75,228.52) 1(281.75,290.09) 1(281.75,290.76) 1(281.75,292.77) 1(281.75,365.72) 1(281.75,366.39) 1(282.42,43.79) 1(282.42,114.74) 1(282.42,115.41) 1(282.42,176.31) 1(282.42,176.98) 1(282.42,177.65) 1(282.42,178.32) 1(282.42,178.99) 1(282.42,184.35) 1(282.42,185.02) 1(282.42,185.68) 1(282.42,186.35) 1(282.42,187.02) 1(282.42,187.69) 1(282.42,188.36) 1(282.42,189.03) 1(282.42,189.7) 1(282.42,190.37) 1(282.42,191.04) 1(282.42,191.71) 1(282.42,192.38) 1(282.42,193.05) 1(282.42,215.13) 1(282.42,215.8) 1(282.42,216.47) 1(282.42,217.14) 1(282.42,217.81) 1(282.42,218.48) 1(282.42,219.15) 1(282.42,219.82) 1(282.42,220.49) 1(282.42,221.16) 1(282.42,221.83) 1(282.42,222.5) 1(282.42,223.17) 1(282.42,223.83) 1(282.42,224.5) 1(282.42,229.19) 1(282.42,229.86) 1(282.42,230.53) 1(282.42,231.2) 1(282.42,231.87) 1(282.42,232.54) 1(282.42,291.43) 1(282.42,292.1) 1(282.42,292.77) 1(282.42,293.44) 1(282.42,294.11) 1(282.42,367.06) 1(283.09,41.79) 1(283.09,114.07) 1(283.09,114.74) 1(283.09,115.41) 1(283.09,116.08) 1(283.09,173.64) 1(283.09,174.31) 1(283.09,174.98) 1(283.09,175.65) 1(283.09,180.33) 1(283.09,181.67) 1(283.09,183.68) 1(283.09,184.35) 1(283.09,185.02) 1(283.09,185.68) 1(283.09,186.35) 1(283.09,187.02) 1(283.09,221.83) 1(283.09,222.5) 1(283.09,223.17) 1(283.09,223.83) 1(283.09,224.5) 1(283.09,225.17) 1(283.09,227.18) 1(283.09,228.52) 1(283.09,233.2) 1(283.09,233.87) 1(283.09,234.54) 1(283.09,235.21) 1(283.09,292.1) 1(283.09,292.77) 1(283.09,294.11) 1(283.09,294.78) 1(283.75,41.12) 1(283.75,112.73) 1(283.75,113.4) 1(283.75,114.74) 1(283.75,115.41) 1(283.75,171.63) 1(283.75,172.3) 1(283.75,172.97) 1(283.75,173.64) 1(283.75,174.31) 1(283.75,180.33) 1(283.75,181.67) 1(283.75,227.18) 1(283.75,228.52) 1(283.75,233.87) 1(283.75,235.21) 1(283.75,235.88) 1(283.75,236.55) 1(283.75,237.22) 1(283.75,294.78) 1(283.75,295.45) 1(283.75,365.72) 1(283.75,366.39) 1(283.75,367.73) 1(284.42,40.45) 1(284.42,41.79) 1(284.42,113.4) 1(284.42,168.95) 1(284.42,171.63) 1(284.42,173.64) 1(284.42,174.31) 1(284.42,233.87) 1(284.42,235.21) 1(284.42,235.88) 1(284.42,236.55) 1(284.42,237.22) 1(284.42,237.89) 1(284.42,239.9) 1(284.42,294.11) 1(284.42,295.45) 1(284.42,296.12) 1(284.42,366.39) 1(284.42,367.06) 1(284.42,368.4) 1(285.09,112.06) 1(285.09,112.73) 1(285.09,113.4) 1(285.09,168.28) 1(285.09,169.62) 1(285.09,170.29) 1(285.09,237.89) 1(285.09,238.56) 1(285.09,239.23) 1(285.09,294.78) 1(285.09,296.12) 1(285.09,367.06) 1(285.09,367.73) 1(285.09,369.07) 1(285.76,39.78) 1(285.76,41.79) 1(285.76,112.06) 1(285.76,112.73) 1(285.76,166.28) 1(285.76,166.94) 1(285.76,167.61) 1(285.76,168.28) 1(285.76,168.95) 1(285.76,169.62) 1(285.76,170.29) 1(285.76,170.96) 1(285.76,171.63) 1(285.76,235.88) 1(285.76,236.55) 1(285.76,237.22) 1(285.76,237.89) 1(285.76,238.56) 1(285.76,239.23) 1(285.76,239.9) 1(285.76,241.24) 1(285.76,241.91) 1(285.76,242.57) 1(285.76,295.45) 1(286.43,39.11) 1(286.43,39.78) 1(286.43,40.45) 1(286.43,109.39) 1(286.43,110.05) 1(286.43,112.06) 1(286.43,162.93) 1(286.43,163.6) 1(286.43,164.27) 1(286.43,164.94) 1(286.43,166.28) 1(286.43,166.94) 1(286.43,168.28) 1(286.43,168.95) 1(286.43,169.62) 1(286.43,170.29) 1(286.43,238.56) 1(286.43,239.23) 1(286.43,239.9) 1(286.43,240.57) 1(286.43,241.24) 1(286.43,241.91) 1(286.43,242.57) 1(286.43,243.91) 1(286.43,244.58) 1(286.43,245.25) 1(286.43,296.12) 1(286.43,296.79) 1(286.43,298.8) 1(286.43,367.73) 1(286.43,369.74) 1(287.1,108.72) 1(287.1,110.05) 1(287.1,110.72) 1(287.1,111.39) 1(287.1,160.25) 1(287.1,162.26) 1(287.1,162.93) 1(287.1,163.6) 1(287.1,164.27) 1(287.1,164.94) 1(287.1,166.28) 1(287.1,166.94) 1(287.1,241.24) 1(287.1,241.91) 1(287.1,242.57) 1(287.1,243.91) 1(287.1,244.58) 1(287.1,245.25) 1(287.1,245.92) 1(287.1,246.59) 1(287.1,247.93) 1(287.1,248.6) 1(287.1,297.46) 1(287.1,298.8) 1(287.1,299.46) 1(287.1,300.13) 1(287.1,370.41) 1(287.77,38.44) 1(287.77,39.11) 1(287.77,39.78) 1(287.77,40.45) 1(287.77,108.05) 1(287.77,109.39) 1(287.77,110.05) 1(287.77,158.24) 1(287.77,160.92) 1(287.77,161.59) 1(287.77,162.26) 1(287.77,163.6) 1(287.77,164.27) 1(287.77,164.94) 1(287.77,165.61) 1(287.77,243.24) 1(287.77,243.91) 1(287.77,244.58) 1(287.77,245.25) 1(287.77,245.92) 1(287.77,246.59) 1(287.77,298.13) 1(287.77,299.46) 1(287.77,369.74) 1(288.44,37.77) 1(288.44,107.38) 1(288.44,108.72) 1(288.44,158.91) 1(288.44,159.58) 1(288.44,249.27) 1(288.44,249.94) 1(288.44,250.61) 1(288.44,298.8) 1(288.44,300.13) 1(288.44,300.8) 1(288.44,301.47) 1(288.44,371.08) 1(289.11,37.1) 1(289.11,38.44) 1(289.11,39.11) 1(289.11,106.71) 1(289.11,107.38) 1(289.11,108.05) 1(289.11,108.72) 1(289.11,109.39) 1(289.11,156.24) 1(289.11,156.91) 1(289.11,157.57) 1(289.11,162.26) 1(289.11,162.93) 1(289.11,245.92) 1(289.11,246.59) 1(289.11,247.26) 1(289.11,251.28) 1(289.11,251.94) 1(289.11,299.46) 1(289.11,300.13) 1(289.11,301.47) 1(289.11,369.74) 1(289.78,36.43) 1(289.78,37.77) 1(289.78,38.44) 1(289.78,105.37) 1(289.78,107.38) 1(289.78,108.05) 1(289.78,155.57) 1(289.78,156.91) 1(289.78,251.94) 1(289.78,252.61) 1(289.78,253.28) 1(289.78,301.47) 1(289.78,302.81) 1(289.78,303.48) 1(289.78,371.75) 1(290.45,37.77) 1(290.45,104.7) 1(290.45,152.89) 1(290.45,153.56) 1(290.45,154.23) 1(290.45,155.57) 1(290.45,156.91) 1(290.45,251.94) 1(290.45,253.28) 1(290.45,254.62) 1(290.45,255.29) 1(290.45,255.96) 1(290.45,302.14) 1(290.45,302.81) 1(291.12,35.76) 1(291.12,105.37) 1(291.12,106.04) 1(291.12,151.55) 1(291.12,152.89) 1(291.12,153.56) 1(291.12,154.23) 1(291.12,154.9) 1(291.12,155.57) 1(291.12,253.28) 1(291.12,253.95) 1(291.12,254.62) 1(291.12,255.29) 1(291.12,255.96) 1(291.12,256.63) 1(291.12,303.48) 1(291.12,371.75) 1(291.12,372.42) 1(291.12,373.09) 1(291.79,35.09) 1(291.79,104.7) 1(291.79,152.22) 1(291.79,154.23) 1(291.79,255.96) 1(291.79,302.81) 1(291.79,372.42) 1(292.46,103.36) 1(292.46,105.37) 1(292.46,148.87) 1(292.46,150.21) 1(292.46,151.55) 1(292.46,152.22) 1(292.46,152.89) 1(292.46,153.56) 1(292.46,254.62) 1(292.46,255.29) 1(292.46,256.63) 1(292.46,257.97) 1(292.46,258.64) 1(292.46,259.98) 1(292.46,303.48) 1(292.46,305.49) 1(292.46,371.75) 1(292.46,373.09) 1(292.46,373.76) 1(293.12,35.76) 1(293.12,102.02) 1(293.12,102.69) 1(293.12,103.36) 1(293.12,104.03) 1(293.12,104.7) 1(293.12,146.87) 1(293.12,147.54) 1(293.12,148.2) 1(293.12,150.21) 1(293.12,150.88) 1(293.12,151.55) 1(293.12,152.22) 1(293.12,256.63) 1(293.12,257.3) 1(293.12,258.64) 1(293.12,260.65) 1(293.12,261.31) 1(293.12,304.15) 1(293.12,304.82) 1(293.12,305.49) 1(293.12,306.16) 1(293.12,372.42) 1(293.79,34.42) 1(293.79,101.35) 1(293.79,102.69) 1(293.79,103.36) 1(293.79,146.2) 1(293.79,148.2) 1(293.79,148.87) 1(293.79,150.21) 1(293.79,258.64) 1(293.79,259.98) 1(293.79,260.65) 1(293.79,261.98) 1(293.79,262.65) 